# Altium footprint library UWB_CAN_R2.PcbLib: 83 footprints (part 1 of 6)
Each footprint in its own frame and in the unit in brackets; x right, y up, seen from the top. Pads: shape width x height; smd on the part's side, far side on the other; paste and mask are expansions set on the pad; w line width, h text height; cw(c..) or ccw(c..) is an arc to the next point about the centre after c.
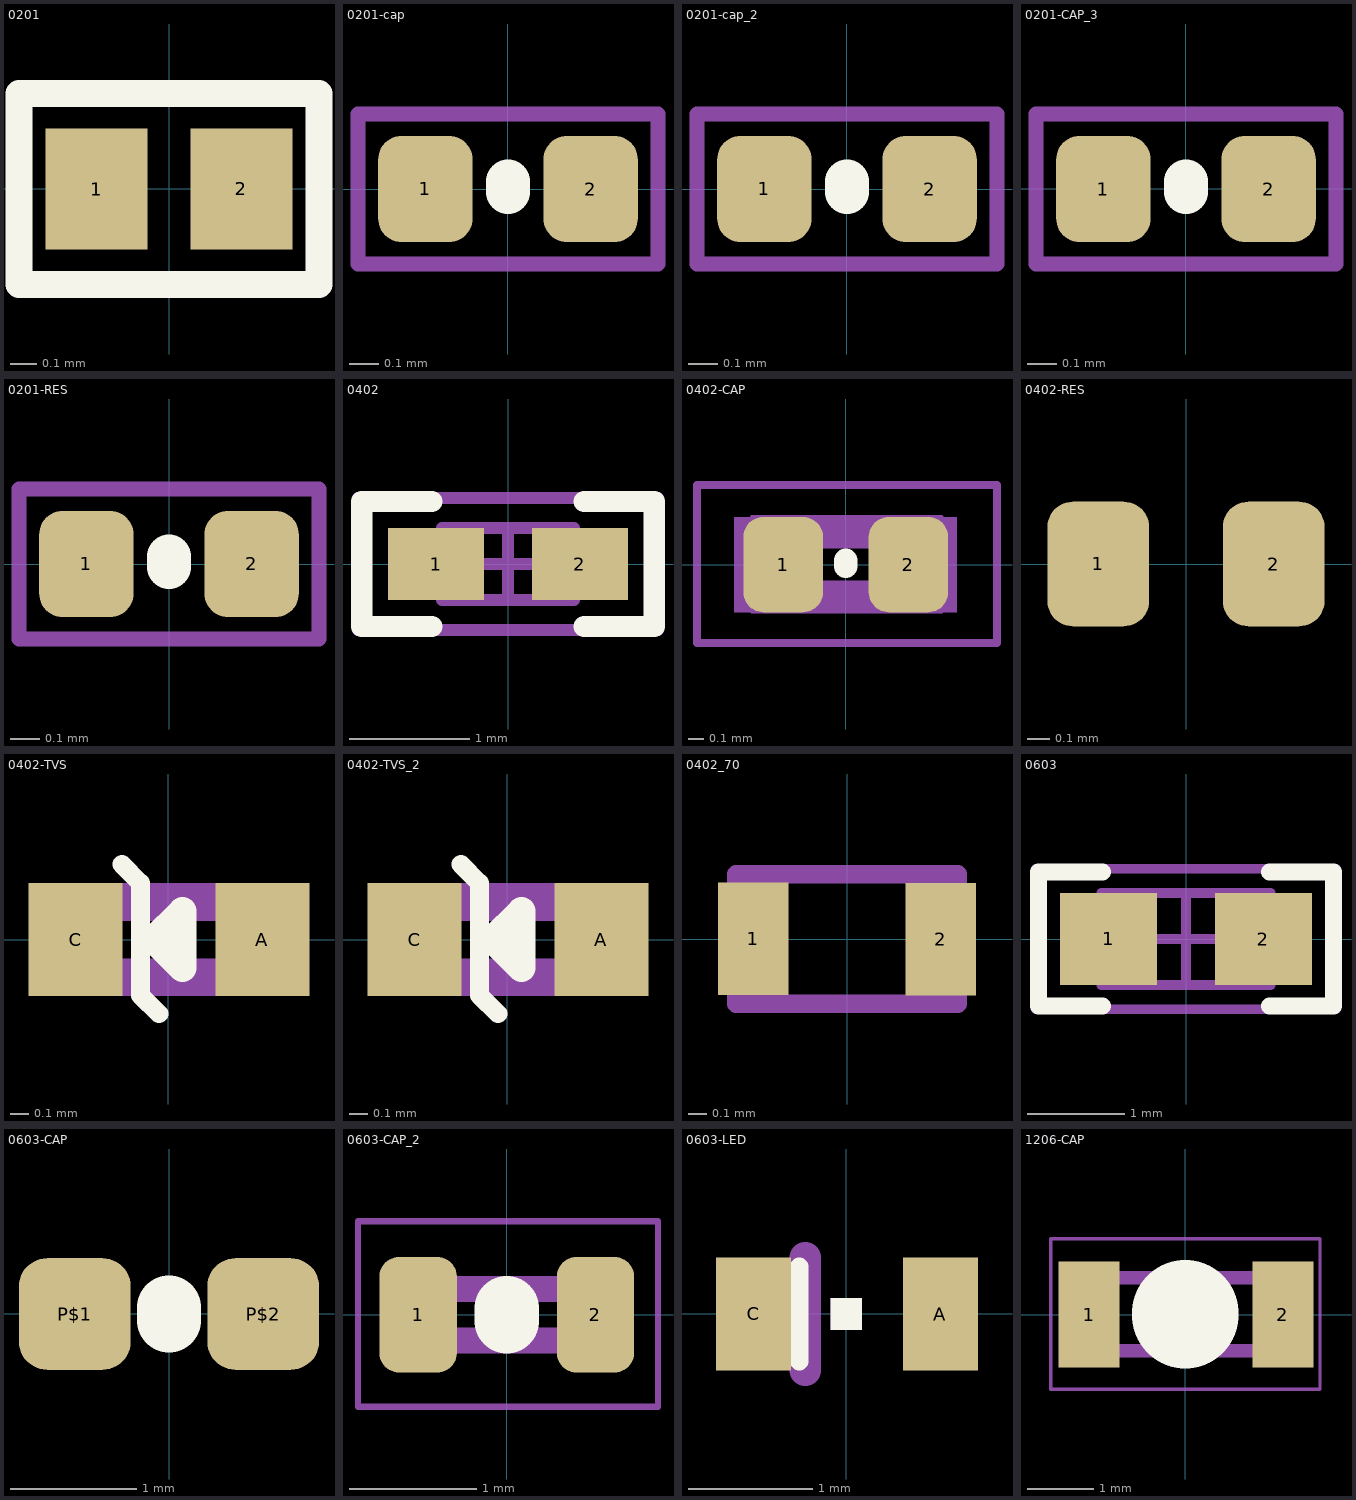
[diagram p0: the footprints below, top view; thin cyan lines are the x and y axes]

## 0201 [mm]
height 1.1
pads (2):
  rect 0.38x0.45 smd paste-0.05: 1(-0.27,0) 2(0.27,0)
Top Overlay:
  lines w0.1: -0.559,-0.356 -0.559,0.356 0.559,0.356 0.559,-0.356 -0.559,-0.356

## 0201-cap [mm]
height 1.1
pads (2):
  rrect50% 0.32x0.36 smd mask+0: 1(-0.28,0) 2(0.28,0)
Top Overlay:
  lines w0.15: 0,-0.01 0,0.025
Mechanical 16:
  lines w0.025: -0.508,-0.254 0.508,-0.254 0.508,0.254 -0.508,0.254 -0.508,-0.254
  lines w0.051: -0.508,-0.254 0.508,-0.254 0.508,0.254 -0.508,0.254 -0.508,-0.254
3D body "cap_0201.step": height 0.3, standoff 0, extent -0.3,-0.15 0.3,0.15

## 0201-cap_2 [mm]
pads (2):
  rrect50% 0.32x0.36 smd mask+0: 1(-0.28,0) 2(0.28,0)
Top Overlay:
  lines w0.15: 0,-0.01 0,0.025
Mechanical 16:
  lines w0.025: -0.508,-0.254 0.508,-0.254 0.508,0.254 -0.508,0.254 -0.508,-0.254
  lines w0.051: -0.508,-0.254 0.508,-0.254 0.508,0.254 -0.508,0.254 -0.508,-0.254
3D body "cap_0201.step": height 0.3, standoff 0, extent -0.3,-0.15 0.3,0.15

## 0201-CAP_3 [mm]
pads (2):
  rrect50% 0.32x0.36 smd mask+0: 1(-0.28,0) 2(0.28,0)
Top Overlay:
  lines w0.15: 0,-0.01 0,0.025
Mechanical 16:
  lines w0.025: -0.508,-0.254 0.508,-0.254 0.508,0.254 -0.508,0.254 -0.508,-0.254
  lines w0.051: -0.508,-0.254 0.508,-0.254 0.508,0.254 -0.508,0.254 -0.508,-0.254
3D body "cap_0201.step": height 0.3, standoff 0, extent -0.3,-0.15 0.3,0.15

## 0201-RES [mm]
height 1.1
pads (2):
  rrect50% 0.32x0.36 smd mask+0: 1(-0.28,0) 2(0.28,0)
Top Overlay:
  lines w0.15: 0,-0.01 0,0.025
Mechanical 16:
  lines w0.025: -0.508,-0.254 -0.508,0.254 0.508,0.254 0.508,-0.254 -0.508,-0.254
  lines w0.051: -0.508,-0.254 -0.508,0.254 0.508,0.254 0.508,-0.254 -0.508,-0.254
3D body "res_0201.step": height 0.12, standoff -0.12, extent -0.3,-0.15 0.3,0.15

## 0402 [mm] "0402 from SM-752 data"
height 0.6
pads (2):
  rect 0.8x0.6 smd: 1(-0.6,0) 2(0.6,0)
Top Overlay:
  lines w0.178: -0.635,-0.521 -1.219,-0.521 -1.219,0.521 -0.635,0.521 ; 0.635,-0.521 1.219,-0.521 1.219,0.521 0.635,0.521
Mechanical 5:
  lines w0.1: -1.25,-0.55 -1.25,0.55 1.25,0.55 1.25,-0.55 -1.25,-0.55
Mechanical 13:
  lines w0.1: -0.35,-0.3 -0.35,0.3 ; 0.35,-0.3 0.35,0.3 ; -0.55,-0.3 0.55,-0.3 0.55,0.3 -0.55,0.3 -0.55,-0.3
Mechanical 15:
  lines w0.1: -0.3,0 0.3,0 ; 0,-0.3 0,0.3 ; -1.25,-0.55 1.25,-0.55 1.25,0.55 -1.25,0.55 -1.25,-0.55
3D body: height 0.6, standoff 0, extent 0.351,-0.299 0.549,0.3
3D body: height 0.6, standoff 0, extent -0.35,-0.3 0.35,0.3
3D body: height 0.6, standoff 0, extent -0.549,-0.3 -0.351,0.299

## 0402-CAP [mil]
height 43.31
pads (2):
  rrect50% 20x24 smd mask+0: 1(-15.75,0) 2(15.75,0)
Top Overlay:
  lines w6: 0,-0.39 0,1
Mechanical 16:
  rectangle: 15.93,-12 27.93,12
  rectangle: -28.07,-12 -16.07,12
  lines w1: -23.62,-11.81 -23.62,12 24,12 24,-11.81 -23.62,-11.81
  lines w2: -37.4,-19.68 -37.4,20 38,20 38,-19.69 -37.4,-19.68
  lines w8: -20,-8 20,-8 ; -20,8 20,8
3D body "cap_0402.STEP": height 19.68, standoff 0, extent -19.69,-9.84 19.69,9.84

## 0402-RES [mil] "0402-RES"
height 66.93
pads (2):
  rrect50% 18x22 smd mask+0: 1(-15.5,0) 2(15.5,0)
3D body "res_0402.STEP": height 19.68, standoff 0, extent -19.68,-9.84 19.68,9.84

## 0402-TVS [mil] "0402-TVS"
pads (2):
  rect 20x24 smd: A(20,0) C(-19.68,0)
Top Overlay:
  lines w4: -9.84,16 -5.91,12 -5.91,-11.81 -1.97,-15.75
  lines w6: -3,0 3,6 3,0 ; -3,0 3,-6 3,0 ; -3,0 3,0
Mechanical 16:
  rectangle: -28,-12 -16,12
  rectangle: 16,-12 28,12
  lines w8: -20,-8 20,-8 ; -20,8 20,8
3D body "res_0402.STEP": height 19.68, standoff 0, extent -19.69,-9.84 19.68,9.84

## 0402-TVS_2 [mil]
pads (2):
  rect 20x24 smd: A(20,0) C(-19.68,0)
Top Overlay:
  lines w4: -9.84,16 -5.91,12 -5.91,-11.81 -1.97,-15.75
  lines w6: -3,0 3,0 ; -3,0 3,-6 3,0 ; -3,0 3,6 3,0
Mechanical 16:
  rectangle: 16,-12 28,12
  rectangle: -28,-12 -16,12
  lines w8: -20,-8 20,-8 ; -20,8 20,8
3D body "res_0402.STEP": height 19.68, standoff 0, extent -19.69,-9.84 19.68,9.84

## 0402_70 [mil] "SMD, 2-Leads, Body 1.2x0.7mm, Height 0.7mm"
height 27.56
pads (2):
  rect 15x24 smd: 1(-20,0) 2(20,0)
Mechanical 5:
  lines w3.94: -23.62,-13.78 -23.62,13.78 23.62,13.78 23.62,-13.78 -23.62,-13.78
3D body: height 27.56, standoff 0, extent 13.78,-13.78 23.62,13.78
3D body: height 27.56, standoff 0, extent -23.62,-13.78 -13.78,13.78
3D body: height 27.56, standoff 0, extent -13.78,-13.78 13.78,13.78

## 0603 [mm] "0603 from SM-752 data"
height 1
pads (2):
  rect 1x0.95 smd: 1(-0.8,0) 2(0.8,0)
Top Overlay:
  lines w0.178: -0.864,-0.691 -1.524,-0.691 -1.524,0.693 -0.864,0.693 ; 0.864,-0.691 1.524,-0.691 1.524,0.693 0.864,0.693
Mechanical 5:
  lines w0.1: -1.55,-0.725 -1.55,0.725 1.55,0.725 1.55,-0.725 -1.55,-0.725
Mechanical 13:
  lines w0.1: -0.55,-0.475 -0.55,0.475 ; 0.55,-0.475 0.55,0.475 ; -0.875,-0.475 0.875,-0.475 0.875,0.475 -0.875,0.475 -0.875,-0.475
Mechanical 15:
  lines w0.1: -0.475,0 0.475,0 ; 0,-0.475 0,0.475 ; -1.55,-0.725 1.55,-0.725 1.55,0.725 -1.55,0.725 -1.55,-0.725
3D body: height 1, standoff 0, extent -0.875,-0.474 -0.551,0.475
3D body: height 1, standoff 0, extent -0.549,-0.475 0.549,0.475
3D body: height 1, standoff 0, extent 0.551,-0.475 0.874,0.474

## 0603-CAP [mil] "0603-CAP"
height 43.31
pads (2):
  rrect50% 35x35 smd mask+0: P$1(-29.5,0) P$2(29.5,0)
Top Overlay:
  lines w20: 0,-2 0,2
3D body "cap_0603.STEP": height 34.25, standoff -0.39, extent -31.5,-15.95 31.5,15.94

## 0603-CAP_2 [mil]
pads (2):
  rrect50% 24x36 smd mask+0: 1(-27.56,0) 2(27.56,0)
Top Overlay:
  lines w20: 0,-2 0,2
Mechanical 16:
  rectangle: -28,-12 -16,12
  rectangle: 15.99,-12 27.99,12
  lines w2: -46.26,-28.54 47,-28.54 47,29 -46.26,29 -46.26,-28.54
  lines w8: -20,-8 20,-8 ; -20,8 20,8
3D body "cap_0603.STEP": height 34.25, standoff -0.39, extent -31.5,-15.95 31.5,15.94

## 0603-LED [mil]
height 43.31
pads (2):
  rect 24x36 smd: A(30,0) C(-29.53,0)
Top Overlay:
  region: -5,-5 5,-5 5,5 -5,5
  lines w5.91: -15,-15 -15,15
Mechanical 16:
  region: -5,-5 5,-5 5,5 -5,5
  lines w10: -13,-18 -13,18

## 1206-CAP [mil] "1206-CAP"
height 43.31
pads (2):
  rect 36x63 smd: 1(-57.09,0) 2(58,0)
Top Overlay:
  lines w63: 0,-0.39 0,1
Mechanical 16:
  rectangle: -68.87,-25.58 -45.24,26.01
  rectangle: 46.03,-25.58 69.03,26.01
  lines w2: -79.72,-44.29 80,-44.29 80,45 -79.72,45 -79.72,-44.29
  lines w8: -45.28,-21.59 46,-21.59 ; -45.28,22 46,22